# Altium footprint library TarabusLib_KAP.PcbLib: 504 footprints (part 17 of 32)
Each footprint in its own frame and in the unit in brackets; x right, y up, seen from the top. Pads: shape width x height; smd on the part's side, far side on the other; paste and mask are expansions set on the pad; w line width, h text height; cw(c..) or ccw(c..) is an arc to the next point about the centre after c.
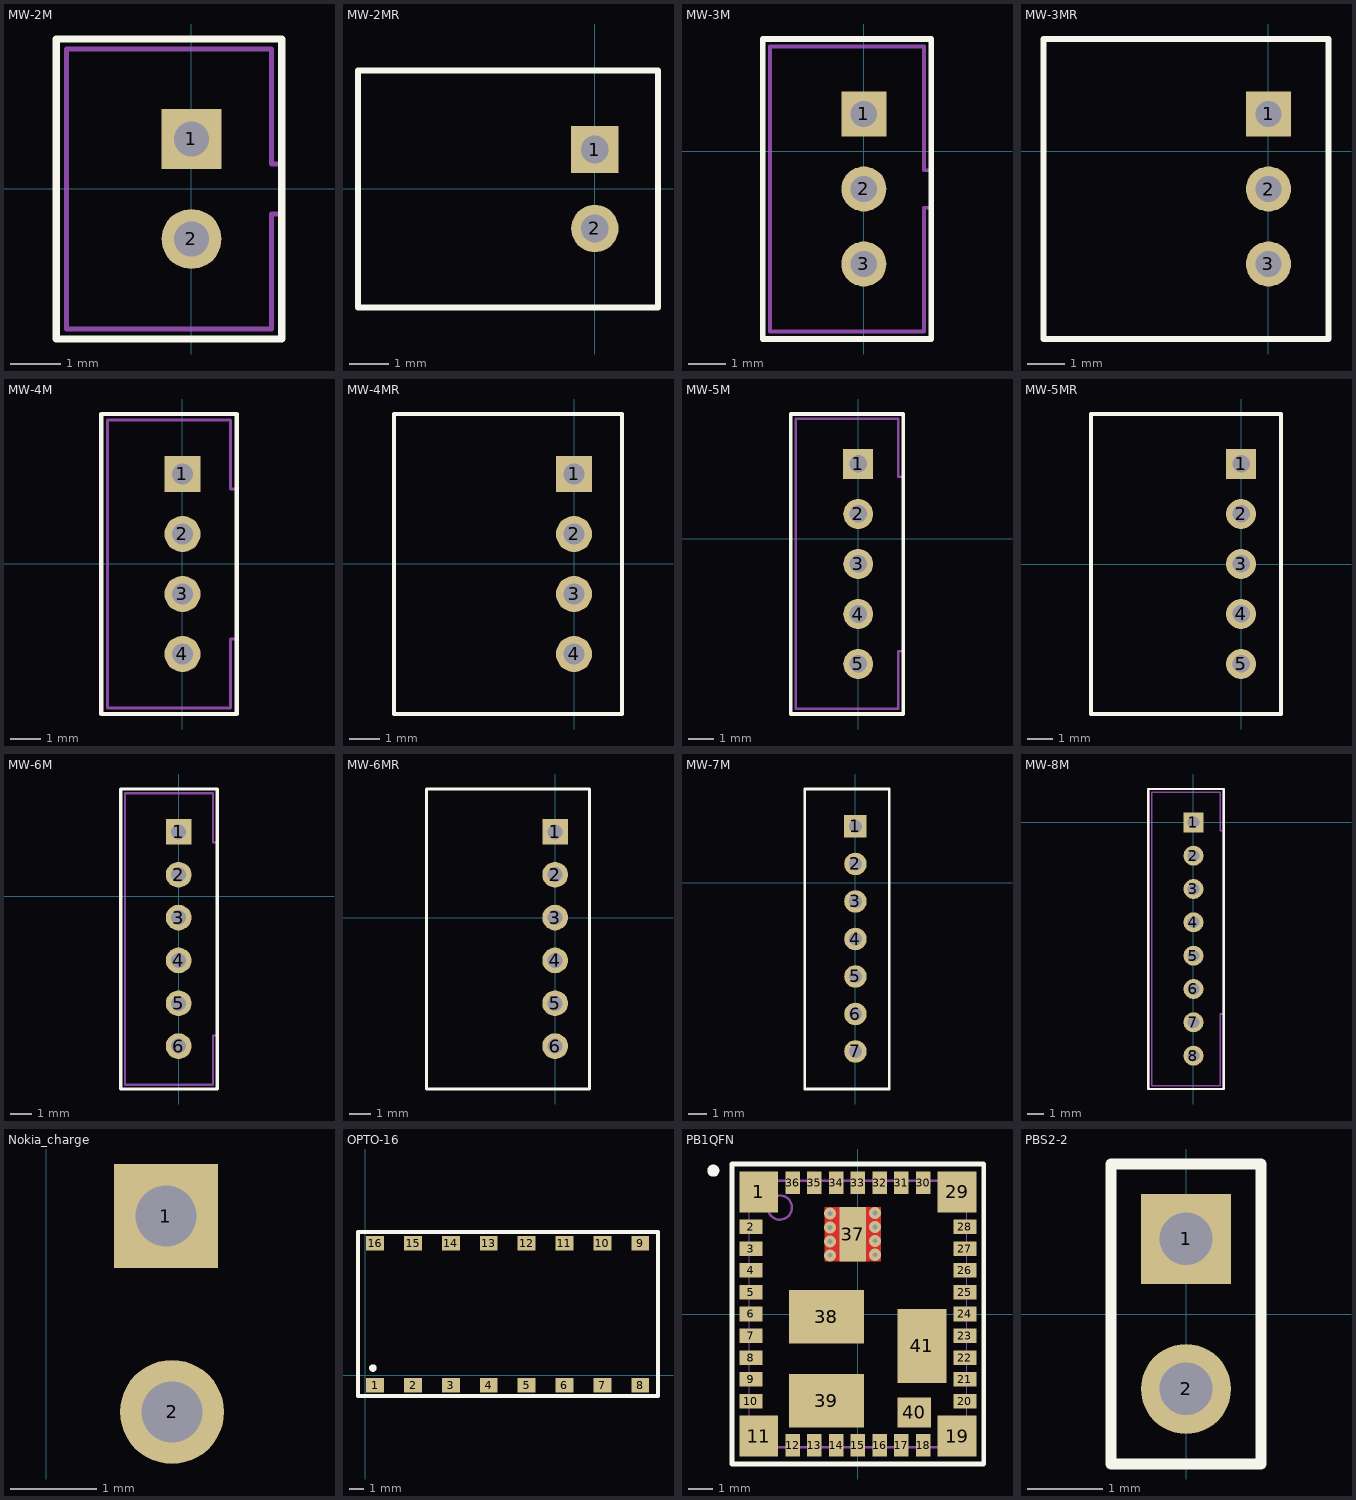
[diagram p16: the footprints below, top view; thin cyan lines are the x and y axes]

## MW-2M [mm]
height 6
pads (2):
  rect 1.2x1.2 hole 0.7: 1(0,1)
  round 1.2 hole 0.7: 2(0,-1)
Top Overlay:
  lines w0.15: -2.7,-3 -2.7,3 1.8,3 1.8,-3 -2.7,-3
Mechanical 7:
  lines w0.1: 1.79,0.5 1.6,0.5 1.6,2.8 -2.5,2.8 -2.5,-2.8 1.6,-2.8 1.6,-0.5 1.8,-0.5 ; -2.7,-3 1.8,-3 1.8,3 -2.7,3 -2.7,-3
Mechanical 10:
  text ".Comment" at -1.27,3.41 h0.6
  text ".Designator" at -1.28,3.98 h0.8
3D body "B2B-PH-K-S.STEP": height 6, standoff -3.4, extent -2.7,-2.95 1.8,2.95

## MW-2MR [mm]
height 4.5
pads (2):
  rect 1.2x1.2 hole 0.7: 1(0,1)
  round 1.2 hole 0.7: 2(0,-1)
Top Overlay:
  lines w0.15: -6,-3 -6,3 1.6,3 1.6,-3 -6,-3
Mechanical 7:
  lines w0.1: -6,-3 1.6,-3 1.6,3 -6,3 -6,-3
Mechanical 10:
  text ".Designator" at -3.43,4 h0.8
  text ".Comment" at -3.42,3.43 h0.6
3D body "S2B-PH-K-S.STEP": height 4.8, standoff -3.4, extent -6,-2.95 1.6,2.95

## MW-3M [mm]
pads (3):
  rect 1.2x1.2 hole 0.7: 1(0,1)
  round 1.2 hole 0.7: 2(0,-1) 3(0,-3)
Top Overlay:
  lines w0.15: -2.7,-5 1.8,-5 1.8,3 -2.7,3 -2.7,-5
Mechanical 7:
  lines w0.1: 1.79,-0.5 1.6,-0.5 1.6,2.8 -2.5,2.8 -2.5,-4.8 1.6,-4.8 1.6,-1.5 1.8,-1.5 ; -2.7,-5 -2.7,3 1.8,3 1.8,-5 -2.7,-5
Mechanical 10:
  text ".Designator" at -1.28,3.98 h0.8
  text ".Comment" at -1.27,3.41 h0.6
3D body "B3B-PH-K-S.STEP": height 6, standoff -3.4, extent -2.7,-4.95 1.8,2.95

## MW-3MR [mm]
pads (3):
  rect 1.2x1.2 hole 0.7: 1(0,1)
  round 1.2 hole 0.7: 2(0,-1) 3(0,-3)
Top Overlay:
  lines w0.15: -6,-5 1.6,-5 1.6,3 -6,3 -6,-5
Mechanical 7:
  lines w0.1: -6,-5 -6,3 1.6,3 1.6,-5 -6,-5
Mechanical 10:
  text ".Comment" at -3.42,3.43 h0.6
  text ".Designator" at -3.43,4 h0.8
3D body "S3B-PH-K-S.STEP": height 4.8, standoff -3.4, extent -6,-4.95 1.6,2.95

## MW-4M [mm]
height 6
pads (4):
  rect 1.2x1.2 hole 0.7: 1(0,3)
  round 1.2 hole 0.7: 2(0,1) 3(0,-1) 4(0,-3)
Top Overlay:
  lines w0.15: -2.7,-5 -2.7,5 1.8,5 1.8,-5 -2.7,-5
Mechanical 7:
  lines w0.1: 1.79,-2.5 1.6,-2.5 1.6,-4.8 -2.5,-4.8 -2.5,4.8 1.6,4.8 1.6,2.5 1.79,2.5 ; -2.7,-5 -2.7,5 1.8,5 1.8,-5 -2.7,-5
Mechanical 10:
  text ".Designator" at -1.28,5.98 h0.8
  text ".Comment" at -1.27,5.41 h0.6
3D body "B4B-PH-K-S.STEP": height 6, standoff -3.4, extent -2.7,-4.95 1.8,4.95

## MW-4MR [mm]
height 4.5
pads (4):
  rect 1.2x1.2 hole 0.7: 1(0,3)
  round 1.2 hole 0.7: 2(0,1) 3(0,-1) 4(0,-3)
Top Overlay:
  lines w0.15: -6,-5 -6,5 1.6,5 1.6,-5 -6,-5
Mechanical 7:
  lines w0.1: -6,-5 1.6,-5 1.6,5 -6,5 -6,-5
Mechanical 10:
  text ".Designator" at -3.43,6.03 h0.8
  text ".Comment" at -3.42,5.46 h0.6
3D body "S4B-PH-K-S.STEP": height 4.8, standoff -3.4, extent -6,-4.95 1.6,4.95

## MW-5M [mm]
pads (5):
  rect 1.2x1.2 hole 0.7: 1(0,3)
  round 1.2 hole 0.7: 2(0,1) 3(0,-1) 4(0,-3) 5(0,-5)
Top Overlay:
  lines w0.15: -2.7,-7 -2.7,5 1.8,5 1.8,-7 -2.7,-7
Mechanical 7:
  lines w0.1: 1.79,-4.5 1.6,-4.5 1.6,-6.8 -2.5,-6.8 -2.5,4.8 1.6,4.8 1.6,2.5 1.79,2.5 ; -2.7,-7 -2.7,5 1.8,5 1.8,-7 -2.7,-7
Mechanical 10:
  text ".Designator" at -1.28,5.98 h0.8
  text ".Comment" at -1.27,5.41 h0.6
3D body "B5B-PH-K-S.STEP": height 6, standoff -3.4, extent -2.7,-6.95 1.8,4.95

## MW-5MR [mm]
height 4.5
pads (5):
  rect 1.2x1.2 hole 0.7: 1(0,4)
  round 1.2 hole 0.7: 2(0,2) 3(0,0) 4(0,-2) 5(0,-4)
Top Overlay:
  lines w0.15: -6,-6 -6,6 1.6,6 1.6,-6 -6,-6
Mechanical 7:
  lines w0.1: -6,-6 -6,6 1.6,6 1.6,-6 -6,-6
Mechanical 10:
  text ".Comment" at -3.42,6.46 h0.6
  text ".Designator" at -3.43,7.03 h0.8
3D body "S5B-PH-K-S.STEP": height 4.8, standoff -3.4, extent -6,-5.95 1.6,5.95

## MW-6M [mm]
pads (6):
  rect 1.2x1.2 hole 0.7: 1(0,3)
  round 1.2 hole 0.7: 2(0,1) 3(0,-1) 4(0,-3) 5(0,-5) 6(0,-7)
Top Overlay:
  lines w0.15: -2.7,-9 -2.7,5 1.8,5 1.8,-9 -2.7,-9
Mechanical 7:
  lines w0.1: 1.79,-6.5 1.6,-6.5 1.6,-8.8 -2.5,-8.8 -2.5,4.8 1.6,4.8 1.6,2.5 1.79,2.5 ; -2.7,-9 -2.7,5 1.8,5 1.8,-9 -2.7,-9
Mechanical 10:
  text ".Designator" at -1.28,5.98 h0.8
  text ".Comment" at -1.27,5.41 h0.6
3D body "B6B-PH-K-S.STEP": height 6, standoff -3.4, extent -2.7,-8.95 1.8,4.95

## MW-6MR [mm]
pads (6):
  rect 1.2x1.2 hole 0.7: 1(0,4)
  round 1.2 hole 0.7: 2(0,2) 3(0,0) 4(0,-2) 5(0,-4) 6(0,-6)
Top Overlay:
  lines w0.15: -6,-8 1.6,-8 1.6,6 -6,6 -6,-8
Mechanical 7:
  lines w0.1: -6,-8 1.6,-8 1.6,6 -6,6 -6,-8
Mechanical 10:
  text ".Designator" at -3.43,7.03 h0.8
  text ".Comment" at -3.42,6.46 h0.6
3D body "S6B-PH-K-S.STEP": height 4.8, standoff -3.4, extent -6,-7.95 1.6,5.95

## MW-7M [mm]
pads (7):
  rect 1.2x1.2 hole 0.7: 1(0,3)
  round 1.2 hole 0.7: 2(0,1) 3(0,-1) 4(0,-3) 5(0,-5) 6(0,-7) 7(0,-9)
Top Overlay:
  lines w0.15: -2.7,-11 -2.7,5 1.8,5 1.8,-11 -2.7,-11
Mechanical 10:
  text ".Designator" at -1.28,5.98 h0.8
  text ".Comment" at -1.27,5.41 h0.6
3D body: height 5, standoff 0, extent -2.7,-11 1.8,5

## MW-8M [mm]
pads (8):
  rect 1.2x1.2 hole 0.7: 1(0,0)
  round 1.2 hole 0.7: 2(0,-2) 3(0,-4) 4(0,-6) 5(0,-8) 6(0,-10) 7(0,-12) 8(0,-14)
Top Overlay:
  lines w0.15: -2.7,-16 -2.7,2 1.8,2 1.8,-16 -2.7,-16
Mechanical 7:
  lines w0.1: 1.79,-11.5 1.6,-11.5 1.6,-15.8 -2.5,-15.8 -2.5,1.8 1.6,1.8 1.6,-0.5 1.79,-0.5 ; -2.7,-16 -2.7,2 1.8,2 1.8,-16 -2.7,-16
Mechanical 10:
  text ".Designator" at -1.28,2.98 h0.8
  text ".Comment" at -1.27,2.41 h0.6
3D body "MW-8M.STEP": height 6, standoff -3, extent -2.8,-15.975 1.7,1.925

## Nokia_charge [mm]
pads (2):
  rect 1.2x1.2 hole 0.7: 1(1.38,-1.48)
  round 1.2 hole 0.7: 2(1.45,-3.74)
3D body "nokia.STEP": height 3.7, standoff 0.1, extent 0,-5.2 6.9,0

## OPTO-16 [mm]
pads (16):
  rect 1.2x0.96 smd: 1(0.651,-0.658) 2(3.191,-0.658) 3(5.731,-0.658) 4(8.271,-0.658) 5(10.811,-0.658) 6(13.351,-0.658) 7(15.891,-0.658) 8(18.431,-0.658) 9(18.431,8.862) 10(15.891,8.862) 11(13.351,8.862) 12(10.811,8.862) 13(8.271,8.862) 14(5.731,8.862) 15(3.191,8.862) 16(0.651,8.862)
Top Overlay:
  circle w0.254: c0.5,0.5 r0.125
  lines w0.254: -0.5,-1.375 19.625,-1.375 19.625,9.625 -0.5,9.625 -0.5,-1.375
3D body "KB847-B.STEP": height 3.85, standoff 0.03, extent -0.36,-0.907 19.46,9.093

## PB1QFN [mm]
height 2.9
pads (41):
  rect 1.6x1.7 smd: 1(-4.1,5.05) 11(-4.1,-5.05) 19(4.1,-5.05) 29(4.1,5.05)
  rect 0.95x0.6 smd: 2(-4.425,3.6) 3(-4.425,2.7) 4(-4.425,1.8) 5(-4.425,0.9) 6(-4.425,0) 7(-4.425,-0.9) 8(-4.425,-1.8) 9(-4.425,-2.7) 10(-4.425,-3.6) 20(4.425,-3.6) 21(4.425,-2.7) 22(4.425,-1.8) 23(4.425,-0.9) 24(4.425,0) 25(4.425,0.9) 26(4.425,1.8) 27(4.425,2.7) 28(4.425,3.6)
  rect 0.6x0.95 smd: 12(-2.7,-5.425) 13(-1.8,-5.425) 14(-0.9,-5.425) 15(0,-5.425) 16(0.9,-5.425) 17(1.8,-5.425) 18(2.7,-5.425) 30(2.7,5.425) 31(1.8,5.425) 32(0.9,5.425) 33(0,5.425) 34(-0.9,5.425) 35(-1.8,5.425) 36(-2.7,5.425)
  rect 1.1x2.25 smd: 37(-0.22,3.3)
  rect 3.1x2.2 smd: 38(-1.3,-0.11) 39(-1.3,-3.59)
  rect 1.4x1.24 smd: 40(2.33,-4.07)
  rect 2.04x3.05 smd: 41(2.65,-1.32)
via 0.71,2.45 diameter 0.5 hole 0.2
via 0.71,3.025 diameter 0.5 hole 0.2
via 0.71,3.6 diameter 0.5 hole 0.2
via 0.71,4.175 diameter 0.5 hole 0.2
via -1.15,2.425 diameter 0.5 hole 0.2
via -1.15,3 diameter 0.5 hole 0.2
via -1.15,3.575 diameter 0.5 hole 0.2
via -1.15,4.15 diameter 0.5 hole 0.2
Top Layer:
  rectangle: -1.375,2.175 0.95,4.425
Top Overlay:
  circle w0.25: c-5.975,5.925 r0.125
  lines w0.2: -5.2,-6.2 5.2,-6.2 5.2,6.2 -5.2,6.2 -5.2,-6.2
Mechanical 7:
  lines w0.05: -4.5,-5.5 -4.5,5.5 4.5,5.5 4.5,-5.5 -4.5,-5.5
Mechanical 9:
  circle w0.1: c-3.225,4.4 r0.5
  lines w0.1: -4.5,-5.5 4.5,-5.5 ; -4.5,5.5 4.5,5.5
3D body: height 2.9, standoff 0.05, extent -4.5,-5.5 4.5,5.5

## PBS2-2 [mm]
height 4.5
pads (2):
  rect 1.2x1.2 hole 0.7: 1(0,1)
  round 1.2 hole 0.7: 2(0,-1)
Top Overlay:
  lines w0.15: -1,-2 1,-2 1,2 -1,2 -1,-2
Mechanical 7:
  lines w0.1: -1,-2 1,-2 1,2 -1,2 -1,-2
Mechanical 10:
  text ".Designator" at -0.575,3.15 h0.8
  text ".Comment" at -0.575,2.475 h0.6
3D body: height 4.5, standoff 0, extent -1,-2 1,2